# Altium footprint library AltiumDesignerLibraries.PcbLib: 313 footprints (part 9 of 20)
Each footprint in its own frame and in the unit in brackets; x right, y up, seen from the top. Pads: shape width x height; smd on the part's side, far side on the other; paste and mask are expansions set on the pad; w line width, h text height; cw(c..) or ccw(c..) is an arc to the next point about the centre after c.
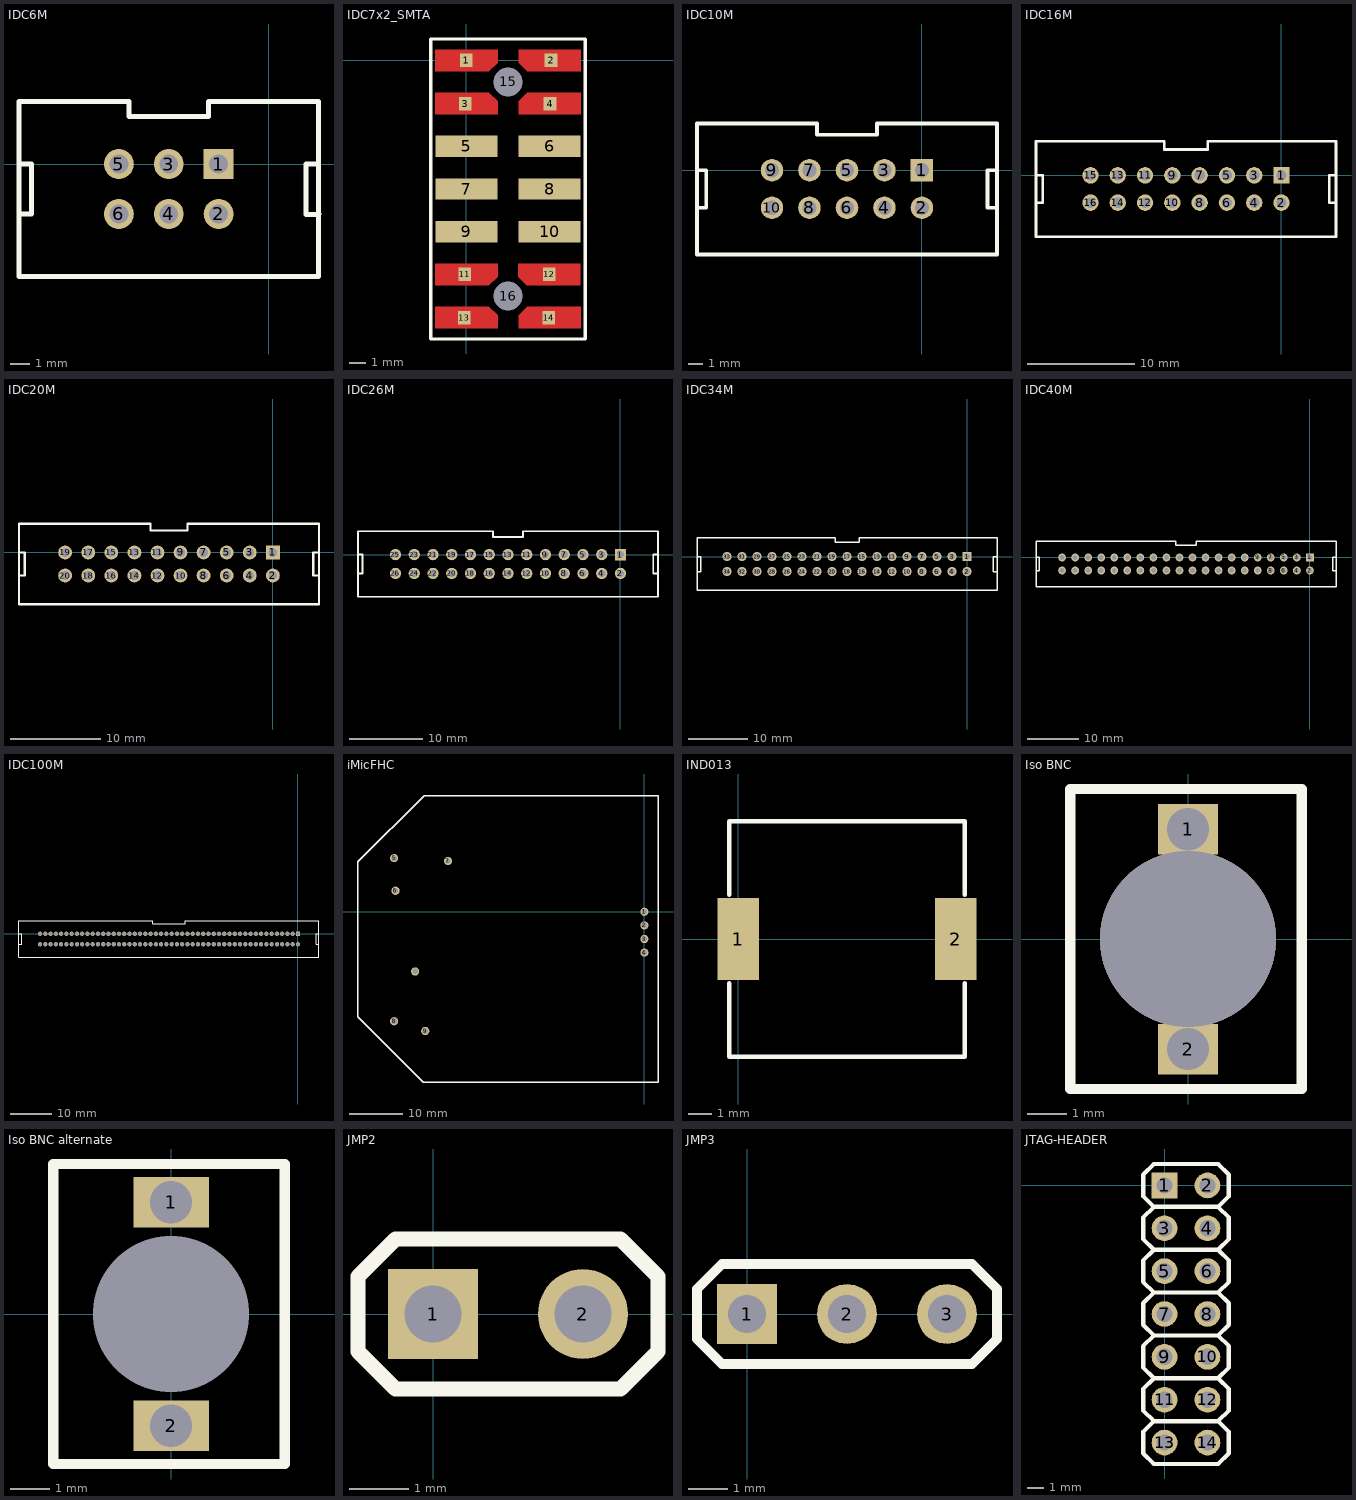
[diagram p8: the footprints below, top view; thin cyan lines are the x and y axes]

## IDC6M [mil]
pads (6):
  rect 60x60 hole 38: 1(-100,0)
  round 60 hole 38: 2(-100,-100) 3(-200,0) 4(-200,-100) 5(-300,0) 6(-300,-100)
Top Overlay:
  lines w10: -500,-100 -475,-100 -475,0 -500,0 ; 100,0 75,0 75,-101 100,-101 101,-100 ; -500,-225 100,-225 100,125 -120,125 -120,95 -280,95 -280,125 -500,125 -500,-225

## IDC7x2_SMTA [mil] "Dual row IDC 100mil spacing SMT"
pads (16):
  rect 29.5x31.5 smd: 1(-0.2,0.39) 2(197.44,0.39) 3(-2.44,-100.67) 4(195.16,-100.67) 11(-3.58,-499.29) 12(192.91,-499.29) 13(-4.68,-600.91) 14(192.36,-600.35)
  rect 145x50 smd mask+3: 5(0,-200) 6(194,-200) 7(0,-300) 8(194,-300) 9(0,-400) 10(194,-400)
  round 50 hole 68 unplated mask+12.5: 15(97,-50) 16(97,-550)
Top Layer:
  region: 72.5,-5 52.5,-25 -72.5,-25 -72.5,25 72.5,25
  region: 121.5,-5 141.5,-25 266.5,-25 266.5,25 121.5,25
  region: 72.5,-95 52.5,-75 -72.5,-75 -72.5,-125 72.5,-125
  region: 121.5,-95 141.5,-75 266.5,-75 266.5,-125 121.5,-125
  region: 72.5,-504.5 52.5,-524.5 -72.5,-524.5 -72.5,-474.5 72.5,-474.5
  region: 121,-505 141,-525 266,-525 266,-475 121,-475
  region: 121.5,-595 141.5,-575 266.5,-575 266.5,-625 121.5,-625
  region: 72.5,-595 52.5,-575 -72.5,-575 -72.5,-625 72.5,-625
Top Overlay:
  lines w8: -83,-650 -83,50 277,50 277,-650 -83,-650
Top Solder:
  region: -75.28,-69.65 -75.28,-131.73 81.69,-131.73 81.69,-68.5 -77.52,-68.5
  region: -75.28,30.87 -75.28,-31.22 81.69,-31.22 81.69,32.01 -77.52,32.01
  region: 113.31,30.87 113.31,-31.22 270.28,-31.22 270.28,32.01 111.06,32.01
  region: 113.31,-69.65 113.31,-131.73 270.28,-131.73 270.28,-68.5 111.06,-68.5
  region: -76.42,-468.27 -76.42,-530.35 80.55,-530.35 80.55,-467.13 -78.66,-467.13
  region: -75.28,-568.74 -75.28,-630.83 81.69,-630.83 81.69,-567.6 -77.52,-567.6
  region: 113.31,-569.88 113.31,-631.97 270.28,-631.97 270.28,-568.74 111.06,-568.74
  region: 113.31,-469.37 113.31,-531.46 270.28,-531.46 270.28,-468.23 111.06,-468.23

## IDC10M [mil]
pads (10):
  rect 60x60 hole 38: 1(0,0)
  round 60 hole 38: 2(0,-100) 3(-100,0) 4(-100,-100) 5(-200,0) 6(-200,-100) 7(-300,0) 8(-300,-100) 9(-400,0) 10(-400,-100)
Top Overlay:
  lines w10: -600,-100 -575,-100 -575,0 -600,0 ; 200,-100 175,-100 175,0 200,0 ; -600,-225 200,-225 200,125 -120,125 -120,95 -280,95 -280,125 -600,125 -600,-225

## IDC16M [mil]
pads (16):
  rect 60x60 hole 38: 1(0,0)
  round 60 hole 38: 2(0,-100) 3(-100,0) 4(-100,-100) 5(-200,0) 6(-200,-100) 7(-300,0) 8(-300,-100) 9(-400,0) 10(-400,-100) 11(-500,0) 12(-500,-100) 13(-600,0) 14(-600,-100) 15(-700,0) 16(-700,-100)
Top Overlay:
  lines w10: -900,-100 -875,-100 -875,0 -900,0 ; 200,-100 175,-100 175,0 200,0 ; -900,-225 -900,125 -430,125 -430,95 -270,95 -270,125 200,125 200,-225 -900,-225

## IDC20M [mil] "2x10 Header for IDC Connector"
height 300
pads (20):
  rect 60x60 hole 38: 1(0,0)
  round 60 hole 38: 2(0,-100) 3(-100,0) 4(-100,-100) 5(-200,0) 6(-200,-100) 7(-300,0) 8(-300,-100) 9(-400,0) 10(-400,-100) 11(-500,0) 12(-500,-100) 13(-600,0) 14(-600,-100) 15(-700,0) 16(-700,-100) 17(-800,0) 18(-800,-100) 19(-900,0) 20(-900,-100)
Top Overlay:
  lines w10: -1100,-100 -1075,-100 -1075,0 -1100,0 ; 200,-100 175,-100 175,0 200,0 ; -1100,-225 200,-225 200,125 -370,125 -370,95 -530,95 -530,125 -1100,125 -1100,-225

## IDC26M [mil]
pads (26):
  rect 60x60 hole 38: 1(0,0)
  round 60 hole 38: 2(0,-100) 3(-100,0) 4(-100,-100) 5(-200,0) 6(-200,-100) 7(-300,0) 8(-300,-100) 9(-400,0) 10(-400,-100) 11(-500,0) 12(-500,-100) 13(-600,0) 14(-600,-100) 15(-700,0) 16(-700,-100) 17(-800,0) 18(-800,-100) 19(-900,0) 20(-900,-100) 21(-1000,0) 22(-1000,-100) 23(-1100,0) 24(-1100,-100) 25(-1200,0) 26(-1200,-100)
Top Overlay:
  lines w10: -1400,-100 -1375,-100 -1375,0 -1400,0 ; 200,-100 175,-100 175,0 200,0 ; -1400,-225 -1400,125 -680,125 -680,95 -520,95 -520,125 200,125 200,-225 -1400,-225

## IDC34M [mil] "2x17 Header for IDC Connector"
height 300
pads (34):
  rect 60x60 hole 38: 1(0,0)
  round 60 hole 38: 2(0,-100) 3(-100,0) 4(-100,-100) 5(-200,0) 6(-200,-100) 7(-300,0) 8(-300,-100) 9(-400,0) 10(-400,-100) 11(-500,0) 12(-500,-100) 13(-600,0) 14(-600,-100) 15(-700,0) 16(-700,-100) 17(-800,0) 18(-800,-100) 19(-900,0) 20(-900,-100) 21(-1000,0) 22(-1000,-100) 23(-1100,0) 24(-1100,-100) 25(-1200,0) 26(-1200,-100) 27(-1300,0) 28(-1300,-100) 29(-1400,0) 30(-1400,-100) 31(-1500,0) 32(-1500,-100) 33(-1600,0) 34(-1600,-100)
Top Overlay:
  lines w10: -1800,-100 -1775,-100 -1775,0 -1800,0 ; 200,-100 175,-100 175,0 200,0 ; -1800,-225 -1800,125 -880,125 -880,95 -720,95 -720,125 200,125 200,-225 -1800,-225

## IDC40M [mil]
pads (40):
  rect 60x60 hole 38: 1(0,0)
  round 60 hole 38: 2(0,-100) 3(-100,0) 4(-100,-100) 5(-200,0) 6(-200,-100) 7(-300,0) 8(-300,-100) 9(-400,0) 10(-400,-100) 11(-500,0) 12(-500,-100) 13(-600,0) 14(-600,-100) 15(-700,0) 16(-700,-100) 17(-800,0) 18(-800,-100) 19(-900,0) 20(-900,-100) 21(-1000,0) 22(-1000,-100) 23(-1100,0) 24(-1100,-100) 25(-1200,0) 26(-1200,-100) 27(-1300,0) 28(-1300,-100) 29(-1400,0) 30(-1400,-100) 31(-1500,0) 32(-1500,-100) 33(-1600,0) 34(-1600,-100) 35(-1700,0) 36(-1700,-100) 37(-1800,0) 38(-1800,-100) 39(-1900,0) 40(-1900,-100)
Top Overlay:
  lines w10: -2100,-100 -2075,-100 -2075,0 -2100,0 ; 200,-100 175,-100 175,0 200,0 ; -2100,-225 -2100,125 -1030,125 -1030,95 -870,95 -870,125 200,125 200,-225 -2100,-225

## IDC100M [mil]
pads (100):
  rect 40x40 hole 35: 1(0,0)
  round 40 hole 35: 2(0,-100) 3(-50,0) 4(-50,-100) 5(-100,0) 6(-100,-100) 7(-150,0) 8(-150,-100) 9(-200,0) 10(-200,-100) 11(-250,0) 12(-250,-100) 13(-300,0) 14(-300,-100) 15(-350,0) 16(-350,-100) 17(-400,0) 18(-400,-100) 19(-450,0) 20(-450,-100) 21(-500,0) 22(-500,-100) 23(-550,0) 24(-550,-100) 25(-600,0) 26(-600,-100) 27(-650,0) 28(-650,-100) 29(-700,0) 30(-700,-100) 31(-750,0) 32(-750,-100) 33(-800,0) 34(-800,-100) 35(-850,0) 36(-850,-100) 37(-900,0) 38(-900,-100) 39(-950,0) 40(-950,-100) 41(-1000,0) 42(-1000,-100) 43(-1050,0) 44(-1050,-100) 45(-1100,0) 46(-1100,-100) 47(-1150,0) 48(-1150,-100) 49(-1200,0) 50(-1200,-100) 51(-1250,0) 52(-1250,-100) 53(-1300,0) 54(-1300,-100) 55(-1350,0) 56(-1350,-100) 57(-1400,0) 58(-1400,-100) 59(-1450,0) 60(-1450,-100) 61(-1500,0) 62(-1500,-100) 63(-1550,0) 64(-1550,-100) 65(-1600,0) 66(-1600,-100) 67(-1650,0) 68(-1650,-100) 69(-1700,0) 70(-1700,-100) 71(-1750,0) 72(-1750,-100) 73(-1800,0) 74(-1800,-100) 75(-1850,0) 76(-1850,-100) 77(-1900,0) 78(-1900,-100) 79(-1950,0) 80(-1950,-100) 81(-2000,0) 82(-2000,-100) 83(-2050,0) 84(-2050,-100) 85(-2100,0) 86(-2100,-100) 87(-2150,0) 88(-2150,-100) 89(-2200,0) 90(-2200,-100) 91(-2250,0) 92(-2250,-100) 93(-2300,0) 94(-2300,-100) 95(-2350,0) 96(-2350,-100) 97(-2400,0) 98(-2400,-100) 99(-2450,0) 100(-2450,-100)
Top Overlay:
  lines w10: -2650,-100 -2625,-100 -2625,0 -2650,0 ; 200,-100 175,-100 175,0 200,0 ; -2650,-225 200,-225 200,125 -1070,125 -1070,95 -1380,95 -1380,125 -2650,125 -2650,-225

## iMicFHC [mil] "iMic footprint for attaching to mother board"
height 500
pads (10):
  round 60 hole 40: 1(0,0) 2(0,-100) 3(0,-200) 4(0,-300) 5(-1835,393) 6(-1825,154) 7(-1440,372) 8(-1835,-803) 9(-1607,-875) 10(-1681,-438)
Top Overlay:
  lines w10: -2100,-770 -2100,365 -1615,850 100,850 100,0 100,-1250 -1620,-1250 -2100,-770

## IND013 [mil] "Power Inductor"
height 149.61
pads (2):
  rect 70x140 smd mask+3: 1(0,0) 2(370,0)
Top Overlay:
  lines w8: -15,-75 -15,-200 385,-200 385,-75 ; -15,75 -15,200 385,200 385,75

## Iso BNC [mil]
pads (2):
  rect 60x50 hole 42: 1(0,109.03) 2(0,-109.37)
via 0,0 diameter 175 hole 175
Top Overlay:
  lines w10: -117,-149 -117,149 113,149 113,-149 -116,-149

## Iso BNC alternate [mil]
pads (3):
  rect 75x50 hole 42: 1(0,111) 2(0,-111)
  rect 0x0 hole 155 unplated: ""(0,0)
Top Overlay:
  lines w10: -117,-149 -117,149 113,149 113,-149 -116,-149

## JMP2 [mil]
pads (2):
  rect 60x60 hole 38: 1(0,0)
  round 60 hole 38: 2(100,0)
Top Overlay:
  lines w10: -50,-25 -25,-50 125,-50 150,-25 150,25 125,50 -25,50 -50,25 -50,-25

## JMP3 [mil]
pads (3):
  rect 60x60 hole 38: 1(0,0)
  round 60 hole 38: 2(100,0) 3(200,0)
Top Overlay:
  lines w10: -50,-25 -25,-50 225,-50 250,-25 250,25 225,50 -25,50 -50,25 -50,-25

## JTAG-HEADER [mil]
pads (14):
  rect 60x60 hole 38: 1(0,0)
  round 60 hole 38: 2(100,0) 3(0,-100) 4(100,-100) 5(0,-200) 6(100,-200) 7(0,-300) 8(100,-300) 9(0,-400) 10(100,-400) 11(0,-500) 12(100,-500) 13(0,-600) 14(100,-600)
Top Overlay:
  lines w10: -25,-550 -50,-575 -50,-625 -25,-650 125,-650 150,-625 150,-575 125,-550 ; -25,-550 -50,-525 -50,-475 -25,-450 ; -25,-550 125,-550 ; -25,-450 -50,-425 -50,-375 -25,-350 ; -25,-450 125,-450 ; -25,-350 -50,-325 -50,-275 -25,-250 ; -25,-350 125,-350 ; -25,-250 -50,-225 -50,-175 -25,-150 ; -25,-250 125,-250 ; -25,-150 -50,-125 -50,-75 -25,-50 ; -25,-150 125,-150 ; -25,-50 125,-50 ; -25,-50 -50,-25 -50,25 -25,50 125,50 150,25 150,-25 125,-50 ; 125,-550 150,-525 150,-475 125,-450 ; 125,-450 150,-425 150,-375 125,-350 ; 125,-350 150,-325 150,-275 125,-250 ; 125,-250 150,-225 150,-175 125,-150 ; 125,-150 150,-125 150,-75 125,-50